# Altium integrated library BJT.IntLib: 163 symbols
Pins are listed as number, name and electrical type; pins without a type are passive.

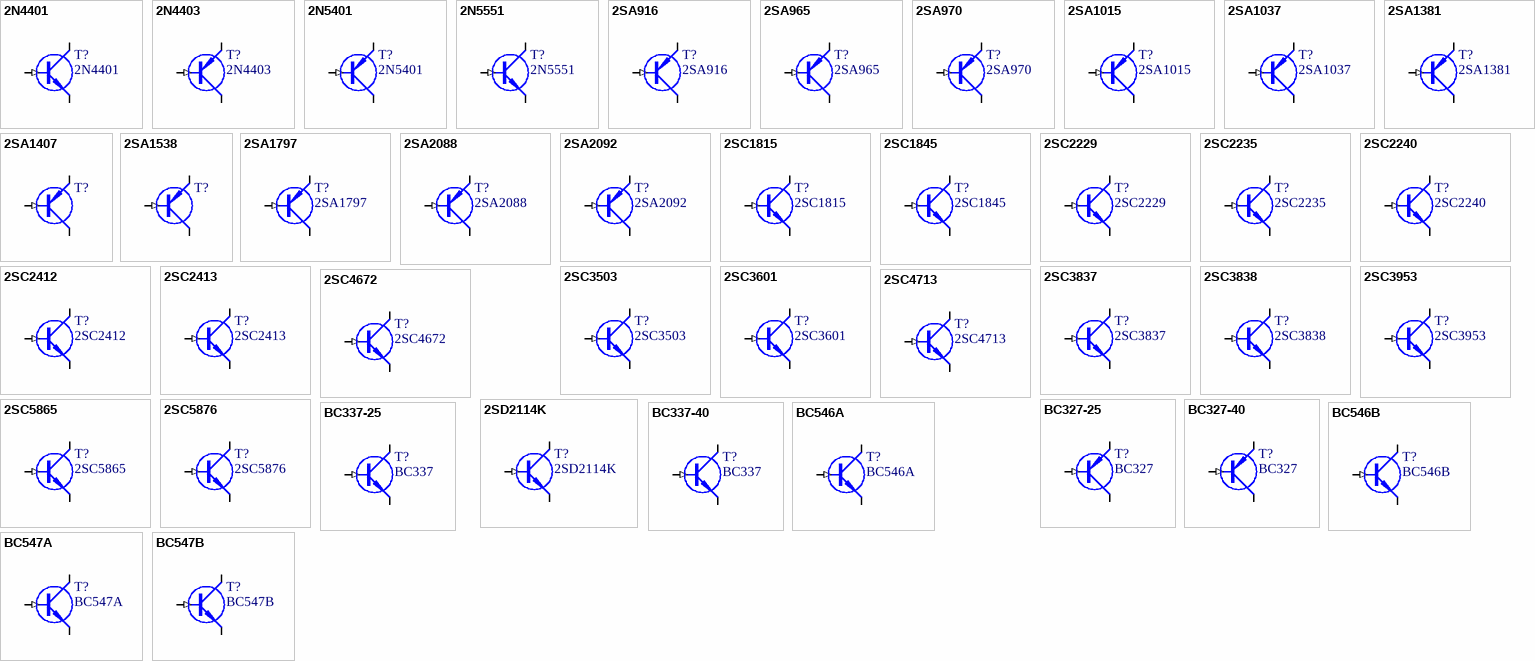
[diagram p0: symbols 2N4401 to BC547B]

## 2N4401
designator T?
40V 0.6A 250MHz 6.5pF (5V); Price: 0.083
footprint TO92C1
simulation model SMBT4401 (NPN)
signal-integrity model Q (Model Description)
pins: 1 C (oc), 2 B (in), 3 E (oe)

## 2N4403
designator T?
40V 0.6A 200MHz 8.5p (10V); Price: 0.083
footprint TO92C1
simulation model SMBT4403 (PNP)
signal-integrity model Q (Model Description)
pins: 1 C (oc), 2 B (in), 3 E (oe)

## 2N5401
designator T?
150V 0.5A 100MHz 6p (10V); Price: 0.083
footprint TO92C1
simulation model Q2N5401 (PNP)
signal-integrity model Q (Model Description)
pins: 1 C (oc), 2 B (in), 3 E (oe)

## 2N5551
designator T?
150V 0.5A 100MHz 6p (10V); Price: 0.083
footprint TO92C1
simulation model Q2N5551 (NPN)
signal-integrity model Q (Model Description)
pins: 1 C (oc), 2 B (in), 3 E (oe)

## 2SA916
designator T?
160V 0.05A 80MHz 2.5p; Price: 0.083
footprint TO92C1
simulation model Q2SA916 (PNP)
signal-integrity model Q (Model Description)
pins: 1 B (in), 2 C (oc), 3 E (oe)

## 2SA965
designator T?
120V 0.8A 120MHz 40p; Price: 0.083
footprint TO92C1
simulation model 2SA965 (PNP)
signal-integrity model Q (Model Description)
pins: 1 B (in), 2 C (oc), 3 E (oe)

## 2SA970
designator T?
120V 0.1A 100MHz 4p; Price: 0.083
footprint TO92C1
simulation model Q2SA970 (PNP)
signal-integrity model Q (Model Description)
pins: 1 B (in), 2 C (oc), 3 E (oe)

## 2SA1015
designator T?
50V 0.15A 80MHz 4p; Price: 0.083
footprint TO92C1
simulation model Q2SA1015 (PNP)
signal-integrity model Q (Model Description)
pins: 1 B (in), 2 C (oc), 3 E (oe)

## 2SA1037
designator T?
50V 0.15A 140MHz5p; Price: 0.083
footprint TO92C1
simulation model Q2SA1037AK (PNP)
signal-integrity model Q (Model Description)
pins: 1 B (in), 2 C (oc), 3 E (oe)

## 2SA1381
designator T?
300V 0.1A 150MHz 2.3p; Price: 0.4
footprint TO126-10
simulation model 2SA1381C (Model Description)
signal-integrity model Q (Model Description)
pins: 1 E (oe), 2 B (in), 3 C (oc)

## 2SA1407
designator T?
200V 0.15A 400MHz 2.5p; Price: 0.4
simulation model 2SA1407 (Model Description)
signal-integrity model Q (Model Description)
footprint TO126-RB400
pins: 1 E (oe), 2 C (oc), 3 B (in)

## 2SA1538
designator T?
120V 0.2A 400MHz 2.1p (30V); Price: 0.4
footprint TO126-10
signal-integrity model Q (Model Description)
pins: 1 E (oe), 2 B (in), 3 C (oc)

## 2SA1797
designator T?
50V 2A 200MHz 36p; Price: 0.083
footprint SOT89 (SC-62)
simulation model Q2SA1797 (PNP)
signal-integrity model Q (Model Description)
pins: 1 B (in), 2 C (oc), 3 E (oe)

## 2SA2088
designator T?
60V 0.5A  400MHz 10p; Price: 0.083
footprint TO92C1
simulation model Q2SA2088 (PNP)
signal-integrity model Q (Model Description)
pins: 1 B (in), 2 C (oc), 3 E (oe)

## 2SA2092
designator T?
60V 1A 300MHz 15p; Price: 0.083
footprint SOT23
simulation model Q2SA2092 (PNP)
signal-integrity model Q (Model Description)
pins: 1 E (oe), 2 B (in), 3 C (oc)

## 2SC1815
designator T?
60V 0.15A  80MHz 2p; Price: 0.05
footprint TO92C1
simulation model Q2SC1815
signal-integrity model Q (Model Description)
pins: 1 B (in), 2 C (oc), 3 E (oe)

## 2SC1845
designator T?
120V 0.05A 110MHz 16p; Price: 0.05
footprint TO92C1
simulation model Q2SC1845
signal-integrity model Q (Model Description)
pins: 1 B (in), 2 C (oc), 3 E (oe)

## 2SC2229
designator T?
150V 0.05A 120MHz 3.5p; Price: 0.05
footprint TO92C1
simulation model Q2SC2229
signal-integrity model Q (Model Description)
pins: 1 B (in), 2 C (oc), 3 E (oe)

## 2SC2235
designator T?
120V 0.8A 120MHz 30p; Price: 0.05
footprint TO92C1
simulation model 2SC2235
signal-integrity model Q (Model Description)
pins: 1 B (in), 2 C (oc), 3 E (oe)

## 2SC2240
designator T?
120V 0.1A 100MHz 3p; Price: 0.05
footprint TO92C1
simulation model Q2SC2240
signal-integrity model Q (Model Description)
pins: 1 B (in), 2 C (oc), 3 E (oe)

## 2SC2412
designator T?
50V 0.15mA 180MHz 3.5p; Price: 0.05
footprint SC75 (SOT-416/SC-90/SC-75; 3 Leads; Body 1.8 x 1.8 mm, inc. leads (LxW max))
simulation model Q2SC2412K
signal-integrity model Q (Model Description)
pins: 1 E (oe), 2 B (in), 3 C (oc)

## 2SC2413
designator T?
25V 50mA 300MHz 1.3p; Price: 0.05
footprint SC75 (SOT-416/SC-90/SC-75; 3 Leads; Body 1.8 x 1.8 mm, inc. leads (LxW max))
simulation model Q2SC2413K
signal-integrity model Q (Model Description)
pins: 1 E (oe), 2 B (in), 3 C (oc)

## 2SC3503
designator T?
300V 0.1A 150MHz 1.8p; Price: 0.35
footprint TO126-10
simulation model 2SC3503C (Model Description)
signal-integrity model Q (Model Description)
pins: 1 E (oe), 2 B (in), 3 C (oc)

## 2SC3601
designator T?
200V 0.15A 400MHz 2p; Price: 0.35
footprint TO126-RB400
simulation model 2SC3601 (Model Description)
signal-integrity model Q (Model Description)
pins: 1 E (oe), 2 C (oc), 3 B (in)

## 2SC3837
designator T?
20V 50mA 1.5G 0.9p; Price: 0.05
footprint SOT23
simulation model Q2SC3837
signal-integrity model Q (Model Description)
pins: 1 E (oe), 2 B (in), 3 C (oc)

## 2SC3838
designator T?
11V 50mA 3.2G 0.8p; Price: 0.05
footprint SOT23
simulation model Q2SC3838
signal-integrity model Q (Model Description)
pins: 1 B (in), 2 E (oe), 3 C (oc)

## 2SC3953
designator T?
120V 0.2A 400MHz 2.8p (30V); Price: 0.35
footprint TO126-10
signal-integrity model Q (Model Description)
pins: 1 E (oe), 2 B (in), 3 C (oc)

## 2SC4672
designator T?
50V 3A 210Hz 25p; Price: 0.05
footprint SOT89 (SC-62)
simulation model Q2SC4672
signal-integrity model Q (Model Description)
pins: 1 E (oe), 2 B (in), 3 C (oc)

## 2SC4713
designator T?
6V 50mA 800MHZ 1p; Price: 0.05
footprint SOT23
simulation model Q2SC4713k
signal-integrity model Q (Model Description)
pins: 1 E (oe), 2 B (in), 3 C (oc)

## 2SC5865
designator T?
60V 1A 250MHz 10p; Price: 0.05
footprint SOT23
simulation model Q2SC5865
signal-integrity model Q (Model Description)
pins: 1 E (oe), 2 B (in), 3 C (oc)

## 2SC5876
designator T?
60V 0.5A 300MHz 5p; Price: 0.05
footprint SC75 (SOT-416/SC-90/SC-75; 3 Leads; Body 1.8 x 1.8 mm, inc. leads (LxW max))
simulation model Q2SC5876
signal-integrity model Q (Model Description)
pins: 1 E (oe), 2 B (in), 3 C (oc)

## 2SD2114K
designator T?
20V 0.5A 350MHz 8p; Price: 0.05
footprint SC75 (SOT-416/SC-90/SC-75; 3 Leads; Body 1.8 x 1.8 mm, inc. leads (LxW max))
simulation model Q2SD2114K (NPN)
signal-integrity model Q (Model Description)
pins: 1 E (oe), 2 B (in), 3 C (oc)

## BC327-25
designator T?, comment BC327
45V 0.8A; Price: 0.062
footprint TO92C
simulation model QBC327-25 (Model Description)
signal-integrity model Q (Model Description)
pins: 1 E (oe), 2 B (in), 3 C (oc)

## BC327-40
designator T?, comment BC327
45V 0.8A; Price: 0.062
footprint TO92C
simulation model QBC327-40 (Model Description)
signal-integrity model Q (Model Description)
pins: 1 E (oe), 2 B (in), 3 C (oc)

## BC337-25
designator T?, comment BC337
45V 0.8A; Price: 0.062
footprint TO92C
simulation model QBC337-25 (Model Description)
signal-integrity model Q (Model Description)
pins: 1 E (oe), 2 B (in), 3 C (oc)

## BC337-40
designator T?, comment BC337
45V 0.8A; Price: 0.062
footprint TO92C
simulation model QBC337-40 (Model Description)
signal-integrity model Q (Model Description)
pins: 1 E (oe), 2 B (in), 3 C (oc)

## BC546A
designator T?
65V 0.1A; Price: 0.05
footprint TO92C
simulation model BC546A
signal-integrity model Q (Model Description)
pins: 1 E (oe), 2 B (in), 3 C (oc)

## BC546B
designator T?
65V 0.1A; Price: 0.05
footprint TO92C
simulation model BC546B
signal-integrity model Q (Model Description)
pins: 1 E (oe), 2 B (in), 3 C (oc)

## BC547A
designator T?
45V 0.1A; Price: 0.05
footprint TO92C
simulation model BC547A
signal-integrity model Q (Model Description)
pins: 1 E (oe), 2 B (in), 3 C (oc)

## BC547B
designator T?
45V 0.1A; Price: 0.05
footprint TO92C
simulation model BC547B
signal-integrity model Q (Model Description)
pins: 1 E (oe), 2 B (in), 3 C (oc)

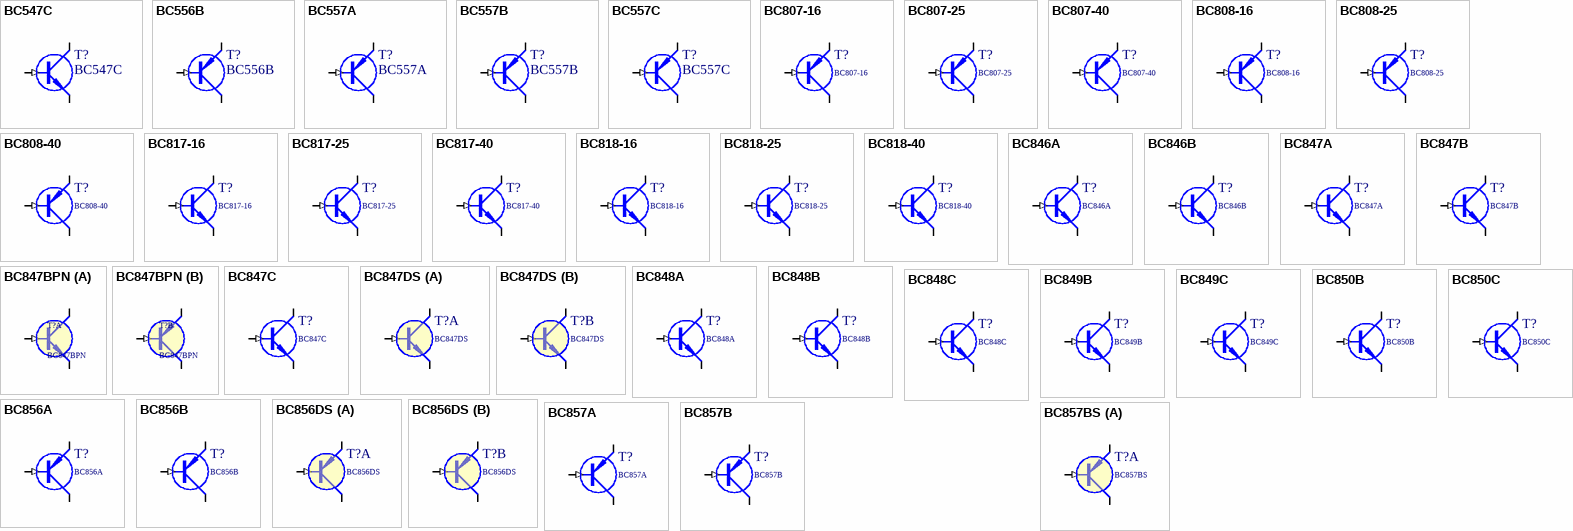
[diagram p1: symbols BC547C to BC857BS]

## BC547C
designator T?
45V 0.1A; Price: 0.05
footprint TO92C
simulation model BC547C
signal-integrity model Q (Model Description)
pins: 1 E (oe), 2 B (in), 3 C (oc)

## BC556B
designator T?
65V 0.1A; Price: 0.05
footprint TO92C
simulation model BC556B (Model Description)
signal-integrity model Q (Model Description)
pins: 1 E (oe), 2 B (in), 3 C (oc)

## BC557A
designator T?
45V 0.1A; Price: 0.05
footprint TO92C
simulation model BC557A (Model Description)
signal-integrity model Q (Model Description)
pins: 1 E (oe), 2 B (in), 3 C (oc)

## BC557B
designator T?
45V 0.1A; Price: 0.05
footprint TO92C
simulation model BC557B (Model Description)
signal-integrity model Q (Model Description)
pins: 1 E (oe), 2 B (in), 3 C (oc)

## BC557C
designator T?
45V 0.1A; Price: 0.05
footprint TO92C
simulation model BC557C (Model Description)
signal-integrity model Q (Model Description)
pins: 1 E (oe), 2 B (in), 3 C (oc)

## BC807-16
designator T?
SMD-SOT23; Price: 0.034
footprint SOT23
simulation model BC807-16 (Model Description)
signal-integrity model Q (Model Description)
pins: 1 B (in), 2 E (oe), 3 C (oc)

## BC807-25
designator T?
SMD-SOT23; Price: 0.034
footprint SOT23
simulation model BC807-25 (Model Description)
signal-integrity model Q (Model Description)
pins: 1 B (in), 2 E (oe), 3 C (oc)

## BC807-40
designator T?
SMD-SOT23; Price: 0.034
footprint SOT23
simulation model BC807-40 (Model Description)
signal-integrity model Q (Model Description)
pins: 1 B (in), 2 E (oe), 3 C (oc)

## BC808-16
designator T?
SMD-SOT23; Price: 0.034
footprint SOT23
simulation model BC808-16 (Model Description)
signal-integrity model Q (Model Description)
pins: 1 B (in), 2 E (oe), 3 C (oc)

## BC808-25
designator T?
SMD-SOT23; Price: 0.034
footprint SOT23
simulation model BC808-25 (Model Description)
signal-integrity model Q (Model Description)
pins: 1 B (in), 2 E (oe), 3 C (oc)

## BC808-40
designator T?
SMD-SOT23; Price: 0.034
footprint SOT23
simulation model BC808-40 (Model Description)
signal-integrity model Q (Model Description)
pins: 1 B (in), 2 E (oe), 3 C (oc)

## BC817-16
designator T?
SMD-SOT23; Price: 0.031
footprint SOT23
simulation model BC817-16 (Model Description)
signal-integrity model Q (Model Description)
pins: 1 B (in), 2 E (oe), 3 C (oc)

## BC817-25
designator T?
SMD-SOT23; Price: 0.031
footprint SOT23
simulation model BC817-25 (Model Description)
signal-integrity model Q (Model Description)
pins: 1 B (in), 2 E (oe), 3 C (oc)

## BC817-40
designator T?
SMD-SOT23; Price: 0.031
footprint SOT23
simulation model BC817-40 (Model Description)
signal-integrity model Q (Model Description)
pins: 1 B (in), 2 E (oe), 3 C (oc)

## BC818-16
designator T?
SMD-SOT23; Price: 0.031
footprint SOT23
simulation model BC818-16 (Model Description)
signal-integrity model Q (Model Description)
pins: 1 B (in), 2 E (oe), 3 C (oc)

## BC818-25
designator T?
SMD-SOT23; Price: 0.031
footprint SOT23
simulation model BC818-25 (Model Description)
signal-integrity model Q (Model Description)
pins: 1 B (in), 2 E (oe), 3 C (oc)

## BC818-40
designator T?
SMD-SOT23; Price: 0.031
footprint SOT23
simulation model BC818-40 (Model Description)
signal-integrity model Q (Model Description)
pins: 1 B (in), 2 E (oe), 3 C (oc)

## BC846A
designator T?
SMD-SOT23; Price: 0.04
footprint SOT23
simulation model BC846A (Model Description)
signal-integrity model Q (Model Description)
pins: 1 B (in), 2 E (oe), 3 C (oc)

## BC846B
designator T?
SMD-SOT23; Price: 0.04
footprint SOT23
simulation model BC846B (Model Description)
signal-integrity model Q (Model Description)
pins: 1 B (in), 2 E (oe), 3 C (oc)

## BC847A
designator T?
SMD-SOT23; Price: 0.04
footprint SOT23
simulation model BC847A (Model Description)
signal-integrity model Q (Model Description)
pins: 1 B (in), 2 E (oe), 3 C (oc)

## BC847B
designator T?
SMD-SOT23; Price: 0.04
footprint SOT23
simulation model BC847B (Model Description)
signal-integrity model Q (Model Description)
pins: 1 B (in), 2 E (oe), 3 C (oc)

## BC847BPN
designator T?
SOT363 45V 0.1A; Price: 0.2
footprint SOT363 (SOT-363/SC-88; 6 Leads; Body 2.2 x 2.2 mm, inc. leads (LxW max))
simulation model BC847BPN (Model Description)
signal-integrity model Q (Model Description)
part A pins: 1 E (oe), 2 B (in), 6 C (oc)
part B pins: 3 C (oc), 4 E (oe), 5 B (in)

## BC847C
designator T?
SMD-SOT23; Price: 0.04
footprint SOT23
simulation model BC847C (Model Description)
signal-integrity model Q (Model Description)
pins: 1 B (in), 2 E (oe), 3 C (oc)

## BC847DS
designator T?
SMD-SOT23; Price: 0.04
footprint SOT23-6 (SOT23, 6-Leads, Body 2.9x1.3mm, Pitch 0.95mm, Lead Span 2.5mm)
simulation model BC847C (Model Description)
signal-integrity model Q (Model Description)
part A pins: 1 E (oe), 2 B (in), 6 C (oc)
part B pins: 3 C (oc), 4 E (oe), 5 B (in)

## BC848A
designator T?
SMD-SOT23; Price: 0.04
footprint SOT23
simulation model BC848A (Model Description)
signal-integrity model Q (Model Description)
pins: 1 B (in), 2 E (oe), 3 C (oc)

## BC848B
designator T?
SMD-SOT23; Price: 0.04
footprint SOT23
simulation model BC848B (Model Description)
signal-integrity model Q (Model Description)
pins: 1 B (in), 2 E (oe), 3 C (oc)

## BC848C
designator T?
SMD-SOT23; Price: 0.04
footprint SOT23
simulation model BC848C (Model Description)
signal-integrity model Q (Model Description)
pins: 1 B (in), 2 E (oe), 3 C (oc)

## BC849B
designator T?
SMD-SOT23; Price: 0.04
footprint SOT23
simulation model BC849B (Model Description)
signal-integrity model Q (Model Description)
pins: 1 B (in), 2 E (oe), 3 C (oc)

## BC849C
designator T?
SMD-SOT23; Price: 0.04
footprint SOT23
simulation model BC849C (Model Description)
signal-integrity model Q (Model Description)
pins: 1 B (in), 2 E (oe), 3 C (oc)

## BC850B
designator T?
SMD-SOT23; Price: 0.04
footprint SOT23
simulation model BC850C (Model Description)
signal-integrity model Q (Model Description)
pins: 1 B (in), 2 E (oe), 3 C (oc)

## BC850C
designator T?
SMD-SOT23; Price: 0.04
footprint SOT23
simulation model BC850C (Model Description)
signal-integrity model Q (Model Description)
pins: 1 B (in), 2 E (oe), 3 C (oc)

## BC856A
designator T?
SMD-SOT23; Price: 0.04
footprint SOT23
simulation model BC856A (Model Description)
signal-integrity model Q (Model Description)
pins: 1 B (in), 2 E (oe), 3 C (oc)

## BC856B
designator T?
SMD-SOT23; Price: 0.04
footprint SOT23
simulation model BC856B (Model Description)
signal-integrity model Q (Model Description)
pins: 1 B (in), 2 E (oe), 3 C (oc)

## BC856DS
designator T?
SMD-SOT23; Price: 0.04
footprint SOT23-6 (SOT23, 6-Leads, Body 2.9x1.3mm, Pitch 0.95mm, Lead Span 2.5mm)
simulation model BC856B (Model Description)
signal-integrity model Q (Model Description)
part A pins: 1 E (oe), 2 B (in), 6 C (oc)
part B pins: 3 C (oc), 4 E (oe), 5 B (in)

## BC857A
designator T?
SMD-SOT23; Price: 0.04
footprint SOT23
simulation model BC857A (Model Description)
signal-integrity model Q (Model Description)
pins: 1 B (in), 2 E (oe), 3 C (oc)

## BC857B
designator T?
SMD-SOT23; Price: 0.04
footprint SOT23
simulation model BC857B (Model Description)
signal-integrity model Q (Model Description)
pins: 1 B (in), 2 E (oe), 3 C (oc)

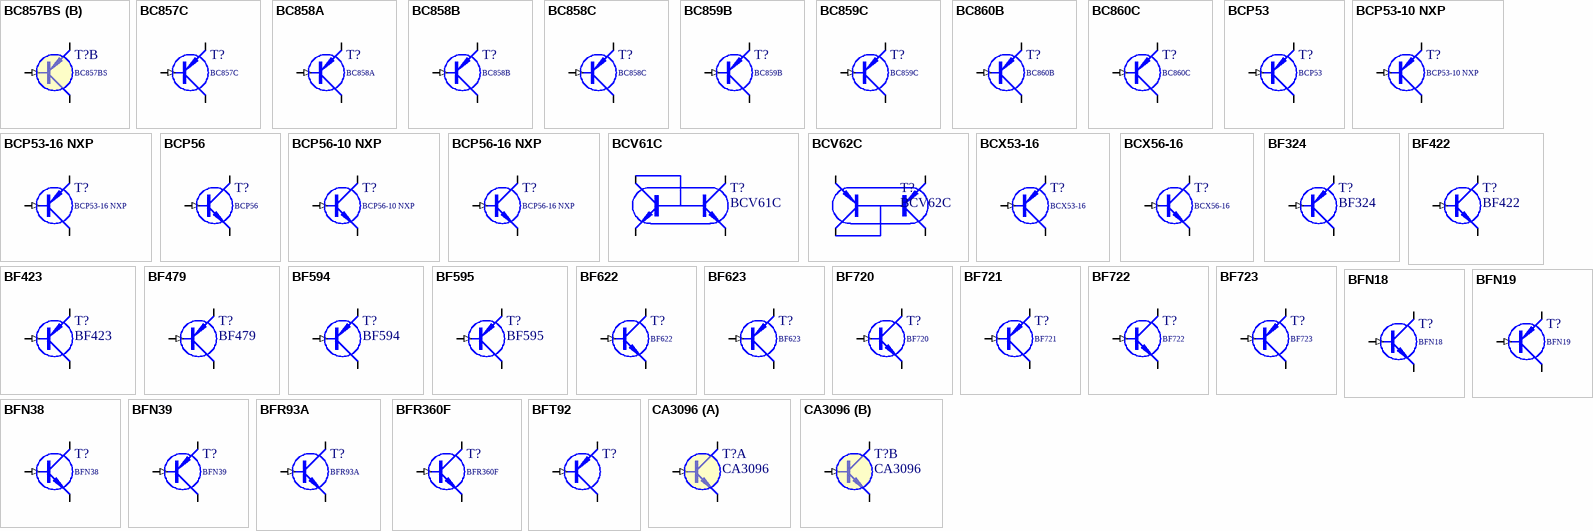
[diagram p2: symbols BC857BS to CA3096]

## BC857BS
designator T?
SMD-SOT23; Price: 0.04
footprint SOT363 (SOT-363/SC-88; 6 Leads; Body 2.2 x 2.2 mm, inc. leads (LxW max))
simulation model BC857BS (Model Description)
signal-integrity model Q (Model Description)
part A pins: 1 E (oe), 2 B (in), 6 C (oc)
part B pins: 3 C (oc), 4 E (oe), 5 B (in)

## BC857C
designator T?
SMD-SOT23; Price: 0.04
footprint SOT23
simulation model BC857C (Model Description)
signal-integrity model Q (Model Description)
pins: 1 B (in), 2 E (oe), 3 C (oc)

## BC858A
designator T?
SMD-SOT23; Price: 0.04
footprint SOT23
simulation model BC858A (Model Description)
signal-integrity model Q (Model Description)
pins: 1 B (in), 2 E (oe), 3 C (oc)

## BC858B
designator T?
SMD-SOT23; Price: 0.04
footprint SOT23
simulation model BC858B (Model Description)
signal-integrity model Q (Model Description)
pins: 1 B (in), 2 E (oe), 3 C (oc)

## BC858C
designator T?
SMD-SOT23; Price: 0.04
footprint SOT23
simulation model BC858C (Model Description)
signal-integrity model Q (Model Description)
pins: 1 B (in), 2 E (oe), 3 C (oc)

## BC859B
designator T?
SMD-SOT23; Price: 0.04
footprint SOT23
simulation model BC859B (Model Description)
signal-integrity model Q (Model Description)
pins: 1 B (in), 2 E (oe), 3 C (oc)

## BC859C
designator T?
SMD-SOT23; Price: 0.04
footprint SOT23
simulation model BC859C (Model Description)
signal-integrity model Q (Model Description)
pins: 1 B (in), 2 E (oe), 3 C (oc)

## BC860B
designator T?
SMD-SOT23; Price: 0.04
footprint SOT23
simulation model BC860B (Model Description)
signal-integrity model Q (Model Description)
pins: 1 B (in), 2 E (oe), 3 C (oc)

## BC860C
designator T?
SMD-SOT23; Price: 0.04
footprint SOT23
simulation model BC860C (Model Description)
signal-integrity model Q (Model Description)
pins: 1 B (in), 2 E (oe), 3 C (oc)

## BCP53
designator T?
SMD-SOT233 80V 1A 145MHz 15p; Price: 0.18
footprint SOT223 (SOT-223/SC-73; 4 Leads; Body 6.7 x 7.3 mm, inc. leads (LxW max))
simulation model BCP53 (Model Description)
signal-integrity model Q (Model Description)
pins: 1 B (in), 2 C (oc), 3 E (oe)

## BCP53-10 NXP
designator T?
SMD-SOT233 80V 1A 145MHz 15p; Price: 0.18
footprint SOT223 (SOT-223/SC-73; 4 Leads; Body 6.7 x 7.3 mm, inc. leads (LxW max))
simulation model QBCP53-10 (Model Description)
signal-integrity model Q (Model Description)
pins: 1 B (in), 2 C (oc), 3 E (oe)

## BCP53-16 NXP
designator T?
SMD-SOT233 80V 1A 145MHz 15p; Price: 0.18
footprint SOT223 (SOT-223/SC-73; 4 Leads; Body 6.7 x 7.3 mm, inc. leads (LxW max))
simulation model QBCP53-16 (Model Description)
signal-integrity model Q (Model Description)
pins: 1 B (in), 2 C (oc), 3 E (oe)

## BCP56
designator T?
SMD-SOT233 80V 1A 180MHz 6p; Price: 0.18
footprint SOT223 (SOT-223/SC-73; 4 Leads; Body 6.7 x 7.3 mm, inc. leads (LxW max))
simulation model BCP56 (Model Description)
signal-integrity model Q (Model Description)
pins: 1 B (in), 2 C (oc), 3 E (oe)

## BCP56-10 NXP
designator T?
SMD-SOT233 80V 1A 180MHz 6p; Price: 0.18
footprint SOT223 (SOT-223/SC-73; 4 Leads; Body 6.7 x 7.3 mm, inc. leads (LxW max))
simulation model QBCP56-16 (Model Description)
signal-integrity model Q (Model Description)
pins: 1 B (in), 2 C (oc), 3 E (oe)

## BCP56-16 NXP
designator T?
SMD-SOT233 80V 1A 180MHz 6p; Price: 0.18
footprint SOT223 (SOT-223/SC-73; 4 Leads; Body 6.7 x 7.3 mm, inc. leads (LxW max))
simulation model QBCP56-16 (Model Description)
signal-integrity model Q (Model Description)
pins: 1 B (in), 2 C (oc), 3 E (oe)

## BCV61C
designator T?
30V 0.1A h 420-800 100MHz; Price: 0.05
footprint SOT143 (SOT-143; 4 Leads; Body 3 x 2.6 mm, inc. leads (LxW max))
simulation model BCV61C
signal-integrity model Q (Model Description)
pins: 1 C-B, 2 C (oc), 3 E (oe), 4 E (oe)

## BCV62C
designator T?
30V 0.1A h 420-800 100MHz; Price: 0.05
footprint SOT143 (SOT-143; 4 Leads; Body 3 x 2.6 mm, inc. leads (LxW max))
signal-integrity model Q (Model Description)
simulation model BCV62C (Model Description)
pins: 1 C-B, 2 C (oc), 3 E (oe), 4 E (oe)

## BCX53-16
designator T?
SMD-SOT89 80V 1A 145MHz 15p; Price: 0.18
footprint SOT89 (SC-62)
simulation model QBCX53-16 (Model Description)
signal-integrity model Q (Model Description)
pins: 1 B (in), 2 C (oc), 3 E (oe)

## BCX56-16
designator T?
SMD-SOT233 80V 1A 180MHz 6p; Price: 0.18
footprint SOT89 (SC-62)
simulation model BCX56-16 (Model Description)
signal-integrity model Q (Model Description)
pins: 1 B (in), 2 C (oc), 3 E (oe)

## BF324
designator T?
30V 25mA 350Mhz NF-3dB; Price: 0.05
footprint TO92CF
simulation model BF324 (Model Description)
signal-integrity model Q (Model Description)
pins: 1 B (in), 2 E (oe), 3 C (oc)

## BF422
designator T?
250V 50mA 60MHz 1.6pF(30V); Price: 0.05
footprint TO92CD
simulation model QBF422 (Model Description)
signal-integrity model Q (Model Description)
pins: 1 B (in), 2 C (oc), 3 E (oe)

## BF423
designator T?
250V 50mA 60MHz 1.6pF(30V); Price: 0.05
footprint TO92CD
simulation model QBF423 (Model Description)
signal-integrity model Q (Model Description)
pins: 1 B (in), 2 C (oc), 3 E (oe)

## BF479
designator T?
30V 50mA 1.4GHz 0.7pF NF-2.5dB; Price: 0.05
footprint TO50A-2
signal-integrity model Q (Model Description)
pins: 1 B (in), 2 E (oe), 3 C (oc)

## BF594
designator T?
20V 30mA 260MHz 0.95pF NF-4dB; Price: 0.05
footprint TO92CF
signal-integrity model Q (Model Description)
pins: 1 B (in), 2 E (oe), 3 C (oc)

## BF595
designator T?
20V 30mA 200MHz 0.95pF NF-4dB; Price: 0.05
footprint TO92CF
signal-integrity model Q (Model Description)
pins: 1 B (in), 2 E (oe), 3 C (oc)

## BF622
designator T?
SMD-SOT233 250V 0.05A 60MHz 1.6p (30V)
footprint SOT89 (SC-62)
simulation model BF622 (Model Description)
signal-integrity model Q (Model Description)
pins: 1 B (in), 2 C (oc), 3 E (oe)

## BF623
designator T?
SMD-SOT233 250V 0.1A 60MHz 2.5p (30V); Price: 0.034
footprint SOT89 (SC-62)
simulation model BF623 (Model Description)
signal-integrity model Q (Model Description)
pins: 1 B (in), 2 C (oc), 3 E (oe)

## BF720
designator T?
SMD-SOT233 300V 0.1A 60MHz 1.6p (30V)
footprint SOT223 (SOT-223/SC-73; 4 Leads; Body 6.7 x 7.3 mm, inc. leads (LxW max))
simulation model BF720 (Model Description)
signal-integrity model Q (Model Description)
pins: 1 B (in), 2 C (oc), 3 E (oe)

## BF721
designator T?
SMD-SOT233 300V 0.1A 60MHz 2.5p (30V); Price: 0.034
footprint SOT223 (SOT-223/SC-73; 4 Leads; Body 6.7 x 7.3 mm, inc. leads (LxW max))
simulation model BF721 (Model Description)
signal-integrity model Q (Model Description)
pins: 1 B (in), 2 C (oc), 3 E (oe)

## BF722
designator T?
SMD-SOT233 250V 0.1A 60MHz 1.6p (30V)
footprint SOT223 (SOT-223/SC-73; 4 Leads; Body 6.7 x 7.3 mm, inc. leads (LxW max))
simulation model BF722 (Model Description)
signal-integrity model Q (Model Description)
pins: 1 B (in), 2 C (oc), 3 E (oe)

## BF723
designator T?
SMD-SOT233 250V 0.1A 60MHz 2.5p (30V); Price: 0.034
footprint SOT223 (SOT-223/SC-73; 4 Leads; Body 6.7 x 7.3 mm, inc. leads (LxW max))
simulation model BF723 (Model Description)
signal-integrity model Q (Model Description)
pins: 1 B (in), 2 C (oc), 3 E (oe)

## BFN18
designator T?
SMD-SOT233 300V 0.2A 70MHz 1.5p(30V); Price: 0.031
footprint SOT89 (SC-62)
simulation model BFN18 (Model Description)
signal-integrity model Q (Model Description)
pins: 1 B (in), 2 C (oc), 3 E (oe)

## BFN19
designator T?
SMD-SOT89 300V 0.2A 100MHz 2.5p(30V); Price: 0.034
footprint SOT89 (SC-62)
simulation model BFN19 (Model Description)
signal-integrity model Q (Model Description)
pins: 1 B (in), 2 C (oc), 3 E (oe)

## BFN38
designator T?
SMD-SOT223 300V 0.2A 70MHz 1.5p(30V)
footprint SOT223 (SOT-223/SC-73; 4 Leads; Body 6.7 x 7.3 mm, inc. leads (LxW max))
simulation model BFN38 (Model Description)
signal-integrity model Q (Model Description)
pins: 1 B (in), 2 C (oc), 3 E (oe)

## BFN39
designator T?
SMD-SOT223 300V 0.2A 100MHz 2.5p(30V)
footprint SOT223 (SOT-223/SC-73; 4 Leads; Body 6.7 x 7.3 mm, inc. leads (LxW max))
simulation model BFN39 (Model Description)
signal-integrity model Q (Model Description)
pins: 1 B (in), 2 C (oc), 3 E (oe)

## BFR93A
designator T?
15V 35mA 6GHz NF 1.9db (1GHz); Price: 0.04
footprint SOT23 (SOT-23; 3 Leads; Body 3.0 x 2.6 mm Pitch 0.95mm)
simulation model BFR93A (Model Description)
signal-integrity model Q (Model Description)
pins: 1 B (in), 2 E (oe), 3 C (oc)

## BFR360F
designator T?
6V 35mA 14GHz NF 1db (1.8GHz); Price: 0.04
footprint TSFP-3 (1.2x1.2mm)
simulation model BFR360F (Model Description)
signal-integrity model Q (Model Description)
pins: 1 B (in), 2 E (oe), 3 C (oc)

## BFT92
designator T?
15V 25mA 5GHz 0.7p; Price: 0.05
footprint SOT23
simulation model BFT92 (Model Description)
signal-integrity model Q (Model Description)
pins: 1 B (in), 2 E (oe), 3 C (oc)

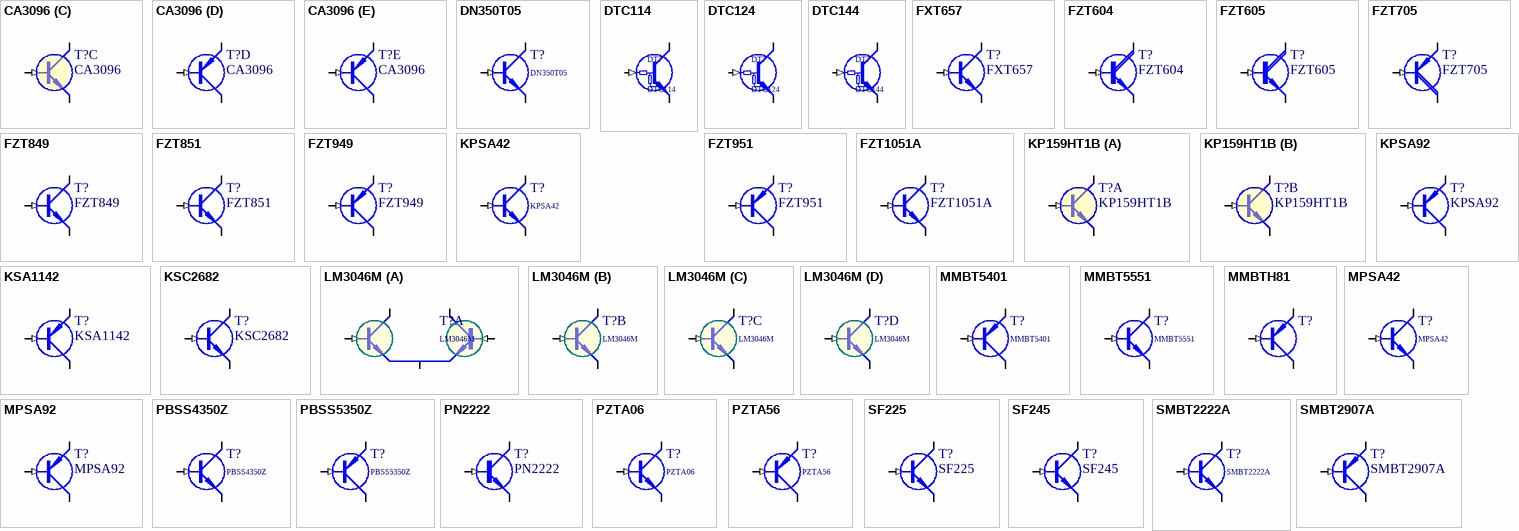
[diagram p3: symbols CA3096 to SMBT2907A]

## CA3096
designator T?
Dual; Price: 1
footprint DIL16-300
signal-integrity model Q (Model Description)
part A pins: 1 B (in), 2 E (oe), 3 C (oc)
part B pins: 4 E (oe), 5 B (in), 6 C (oc)
part C pins: 7 E (oe), 8 B (in), 9 C (oc)
part D pins: 10 E (oe), 11 B (in), 12 C (oc)
part E pins: 13 E (oe), 14 B (in), 15 C (oc), 16 S hidden to No

## DN350T05
designator T?
350V 0.5A SMD-SOT23; Price: 1
footprint SOT23
signal-integrity model Q (Model Description)
pins: 1 B (in), 2 E (oe), 3 C (oc)

## DTC114
designator DT?
10k-10k; Price: 1
footprint E-Line-D
signal-integrity model Q (Model Description)
pins: 1 B (in), 2 C (oc), 3 E (oe)
text: 10k

## DTC124
designator DT?
22k-22k; Price: 0.1
footprint E-Line-D
signal-integrity model Q (Model Description)
pins: 1 B (in), 2 C (oc), 3 E (oe)
text: 22k

## DTC144
designator DT?
47k-47k; DTC144: 0.1
footprint E-Line-D
signal-integrity model Q (Model Description)
pins: 1 B (in), 2 C (oc), 3 E (oe)
text: 44k

## FXT657
designator T?
300V 1A 30MHz 20pF; Price: 1
footprint E-Line-D
signal-integrity model Q (Model Description)
pins: 1 B (in), 2 C (oc), 3 E (oe)

## FZT604
designator T?
100V 1.5A 150MHz; Price: 1
footprint SOT223 (SOT-223/SC-73; 4 Leads; Body 6.7 x 7.3 mm, inc. leads (LxW max))
signal-integrity model Q (Model Description)
simulation model XFZT604 (Model Description)
pins: 1 B (in), 2 C (oc), 3 E (oe)

## FZT605
designator T?
120V 2A 150MHz; Price: 1
footprint SOT223 (SOT-223/SC-73; 4 Leads; Body 6.7 x 7.3 mm, inc. leads (LxW max))
signal-integrity model Q (Model Description)
simulation model XFZT605 (Model Description)
pins: 1 B (in), 2 C (oc), 3 E (oe)

## FZT705
designator T?
120V 2A 160MHz; Price: 1.087
footprint SOT223 (SOT-223/SC-73; 4 Leads; Body 6.7 x 7.3 mm, inc. leads (LxW max))
signal-integrity model Q (Model Description)
simulation model XFZT705 (Model Description)
pins: 1 B (in), 2 C (oc), 3 E (oe)

## FZT849
designator T?
25V 5A 100MHz; Price: 0.68
footprint E-Line 2.54
signal-integrity model Q (Model Description)
simulation model FZT849 (Model Description)
pins: 1 B (in), 2 C (oc), 3 E (oe)

## FZT851
designator T?
60V 6A 130MHz 45p; Price: 0.88
footprint E-Line 2.54
simulation model FZT851 (NPN)
signal-integrity model Q (Model Description)
pins: 1 B (in), 2 C (oc), 3 E (oe)

## FZT949
designator T?
30V 4.5A 100MHz; Price: 1.08
footprint E-Line 2.54
simulation model FZT949 (Model Description)
signal-integrity model Q (Model Description)
pins: 1 B (in), 2 C (oc), 3 E (oe)

## FZT951
designator T?
60V 5A 120MHz 74p; Price: 1.04
footprint E-Line 2.54
simulation model FZT951 (Model Description)
signal-integrity model Q (Model Description)
pins: 1 B (in), 2 C (oc), 3 E (oe)

## FZT1051A
designator T?
40V 4A 155MHz 27p; Price: 0.90
footprint E-Line 2.54
signal-integrity model Q (Model Description)
simulation model FZT1051A (Model Description)
pins: 1 B (in), 2 C (oc), 3 E (oe)

## KP159HT1B
designator T?
Dual; Price: 1
footprint DIL8-300a
signal-integrity model Q (Model Description)
part A pins: 2 C (oc), 3 B (in), 4 E (oe)
part B pins: 5 E (oe), 6 B (in), 7 C (oc)

## KPSA42
designator T?
300V 0.6A 50MHz 3pF(20V); Price: 0.09
footprint TO92C1
simulation model MPSA42 (Model Description)
signal-integrity model Q (Model Description)
pins: 1 C (oc), 2 B (in), 3 E (oe)

## KPSA92
designator T?
300V 0.5A 50MHz 6pF(20V); Price: 0.14
footprint TO92C1
simulation model MPSA92 (PNP)
signal-integrity model Q (Model Description)
pins: 1 C (oc), 2 B (in), 3 E (oe)

## KSA1142
designator T?
180V 0.1A 180MHz 4.5p (10V); Price: 0.5
footprint TO126-10
footprint TO126-RA400
simulation model KSA1142 (Model Description)
signal-integrity model Q (Model Description)
pins: 1 E (oe), 2 C (oc), 3 B (in)

## KSC2682
designator T?
180V 0.1A 200MHz 3.2p (10V); Price: 0.5
footprint TO126-RA400
footprint TO126-10
simulation model KSC2682 (Model Description)
signal-integrity model Q (Model Description)
pins: 1 E (oe), 2 C (oc), 3 B (in)

## LM3046M
designator T?
SMD-SO14-150; Price: 1.32
footprint SO14-150
signal-integrity model Q (Model Description)
simulation model CA3046 (Model Description)
part A pins: 1 C (oc), 2 B (in), 3 E (oe), 4 B (in), 5 C (oc)
part B pins: 6 B (in), 7 E (oe), 8 C (oc)
part C pins: 9 B (in), 10 E (oe), 11 C (oc)
part D pins: 12 B (in), 13 E (oe), 14 C (oc)

## MMBT5401
designator T?
150V 0.6A 300MHz; Price: 0.06
footprint SOT23
simulation model Q2N5401 (Model Description)
signal-integrity model Q (Model Description)
pins: 1 B (in), 2 E (oe), 3 C (oc)

## MMBT5551
designator T?
160V 0.6A 300MHz; Price: 0.06
footprint SOT23
simulation model Q2N5551 (Model Description)
signal-integrity model Q (Model Description)
pins: 1 B (in), 2 E (oe), 3 C (oc)

## MMBTH81
designator T?
20V 50mA 600Mhz; Price: 0.05
footprint SOT23 (SOT-23; 3 Leads; Body 3.0 x 2.6 mm Pitch 0.95mm)
simulation model MMBTH81 (Model Description)
signal-integrity model Q (Model Description)
pins: 1 B (in), 2 E (oe), 3 C (oc)

## MPSA42
designator T?
300V 0.6A 50MHz 3pF(20V); Price: 0.09
footprint SOT23
simulation model MPSA42 (Model Description)
signal-integrity model Q (Model Description)
pins: 1 B (in), 2 E (oe), 3 C (oc)

## MPSA92
designator T?
300V 0.5A 50MHz 6pF(20V); Price: 0.14
footprint SOT23
simulation model MPSA92 (PNP)
signal-integrity model Q (Model Description)
pins: 1 B (in), 2 E (oe), 3 C (oc)

## PBSS4350Z
designator T?
SMD-SOT223 50V 3A 100MHz 30p
footprint SOT223 (SOT-223/SC-73; 4 Leads; Body 6.7 x 7.3 mm, inc. leads (LxW max))
simulation model PBSS4350D (Model Description)
signal-integrity model Q (Model Description)
pins: 1 B (in), 2 C (oc), 3 E (oe)

## PBSS5350Z
designator T?
SMD-SOT223 50V 3A 100MHz 40p
footprint SOT223 (SOT-223/SC-73; 4 Leads; Body 6.7 x 7.3 mm, inc. leads (LxW max))
simulation model PBSS5350D (Model Description)
signal-integrity model Q (Model Description)
pins: 1 B (in), 2 C (oc), 3 E (oe)

## PN2222
designator T?
40V 0.6A 25/60nS 300MHz  5p(10V); Price: 0.075
footprint TO92C
simulation model QPMBT2222 (Model Description)
signal-integrity model Q (Model Description)
pins: 1 E (oe), 2 B (in), 3 C (oc)

## PZTA06
designator T?
SMD-SOT233 80V 0.5A 50MHz 12p; Price: 0.18
footprint SOT223 (SOT-223/SC-73; 4 Leads; Body 6.7 x 7.3 mm, inc. leads (LxW max))
simulation model MPSA06 (Model Description)
signal-integrity model Q (Model Description)
pins: 1 B (in), 2 C (oc), 3 E (oe)

## PZTA56
designator T?
SMD-SOT233 80V 0.5A 50MHz 15p; Price: 0.18
footprint SOT223 (SOT-223/SC-73; 4 Leads; Body 6.7 x 7.3 mm, inc. leads (LxW max))
simulation model MPSA56 (Model Description)
signal-integrity model Q (Model Description)
pins: 1 B (in), 2 C (oc), 3 E (oe)

## SF225
designator T?
25V 25mA 500MHz 0.6pF; Price: 0.05
footprint E-Line-F
signal-integrity model Q (Model Description)
pins: 1 B (in), 2 E (oe), 3 C (oc)

## SF245
designator T?
25V 25mA 800MHz 0.45pF; Price: 0.05
footprint E-Line-F
signal-integrity model Q (Model Description)
pins: 1 B (in), 2 E (oe), 3 C (oc)

## SMBT2222A
designator T?
40V 0.6A 25/60nS 300MHz  5p(10V); Price: 0.16
footprint SOT23
simulation model Q2N2222A (Model Description)
signal-integrity model Q (Model Description)
pins: 1 B (in), 2 E (oe), 3 C (oc)

## SMBT2907A
designator T?
60V 0.6A 10/30nS 200MHz 8p(10V); Price: 0.083
footprint SOT23
simulation model SMBT2907A (PNP)
signal-integrity model Q (Model Description)
pins: 1 E (oe), 2 B (in), 3 C (oc)

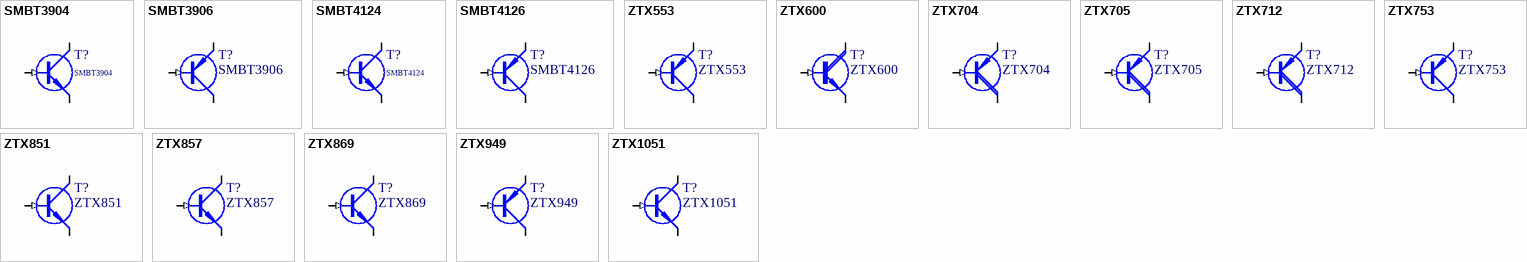
[diagram p4: symbols SMBT3904 to ZTX1051]

## SMBT3904
designator T?
40V 0.2A 300MHz 3.5p(5V) 5dB; Price: 0.16
footprint SOT23
simulation model SMBT3904 (Model Description)
signal-integrity model Q (Model Description)
pins: 1 B (in), 2 E (oe), 3 C (oc)

## SMBT3906
designator T?
40V 0.2A 250MHz 3.5p(5V) 4dB; Price: 0.083
footprint SOT23
simulation model SMBT3906 (PNP)
signal-integrity model Q (Model Description)
pins: 1 E (oe), 2 B (in), 3 C (oc)

## SMBT4124
designator T?
25V 0.2A 300MHz 4p   (5V) 5dB; Price: 0.16
footprint SOT23
simulation model SMBT4124 (Model Description)
signal-integrity model Q (Model Description)
pins: 1 B (in), 2 E (oe), 3 C (oc)

## SMBT4126
designator T?
25V 0.2A 250MHz 4.5p(5V) 4dB; Price: 0.083
footprint SOT23
simulation model SMBT4126 (PNP)
signal-integrity model Q (Model Description)
pins: 1 E (oe), 2 B (in), 3 C (oc)

## ZTX553
designator T?
100V 1A 150MHz; Price: 0.42
footprint E-Line 2.54
simulation model ZTX553 (Model Description)
signal-integrity model Q (Model Description)
pins: 1 E (oe), 2 B (in), 3 C (oc)

## ZTX600
designator T?
140V 1A 150MHz; Price: 1
footprint E-Line 2.54
signal-integrity model Q (Model Description)
pins: 1 E (oe), 2 B (in), 3 C (oc)

## ZTX704
designator T?
100V 1A 160MHz; Price: 1.087
footprint E-Line 2.54
signal-integrity model Q (Model Description)
simulation model XZTX704 (Model Description)
pins: 1 E (oe), 2 B (in), 3 C (oc)

## ZTX705
designator T?
120V 1A 160MHz; Price: 1.087
footprint E-Line 2.54
signal-integrity model Q (Model Description)
simulation model XZTX705 (Model Description)
pins: 1 E (oe), 2 B (in), 3 C (oc)

## ZTX712
designator T?
60V 0.8A; Price: 0.878
footprint E-Line 2.54
signal-integrity model Q (Model Description)
pins: 1 E (oe), 2 B (in), 3 C (oc)

## ZTX753
designator T?
80V 2A 100MHz; Price: 0.75
footprint E-Line 2.54
simulation model ZTX753 (Model Description)
signal-integrity model Q (Model Description)
pins: 1 E (oe), 2 B (in), 3 C (oc)

## ZTX851
designator T?
60V 5A 130MHz; Price: 1
footprint E-Line 2.54
simulation model ZTX851 (NPN)
signal-integrity model Q (Model Description)
pins: 1 E (oe), 2 B (in), 3 C (oc)

## ZTX857
designator T?
300V 3A 80MHz; Price: 1.056
footprint E-Line 2.54
simulation model ZTX857 (Model Description)
signal-integrity model Q (Model Description)
pins: 1 E (oe), 2 B (in), 3 C (oc)

## ZTX869
designator T?
25V 5A 100MHz; Price: 1.056
footprint E-Line 2.54
signal-integrity model Q (Model Description)
pins: 1 E (oe), 2 B (in), 3 C (oc)

## ZTX949
designator T?
30V 4.5A 100MHz; Price: 1.08
footprint E-Line 2.54
simulation model ZTX949 (Model Description)
signal-integrity model Q (Model Description)
pins: 1 E (oe), 2 B (in), 3 C (oc)

## ZTX1051
designator T?
40V 4A 155MHz 27p; Price: 0.816
footprint E-Line 2.54
signal-integrity model Q (Model Description)
simulation model ZTX1051A (Model Description)
pins: 1 E (oe), 2 B (in), 3 C (oc)